# Altium schematic symbol library jlcpcb_2025_04_inductors_extended_0603.schlib: 1269 symbols (part 6 of 7) (continued)
## SDWL1608C2N2SSTF
designator L?  Inductance: 2.2nH
Inductor, 2.2nH, 150mΩ, 700mA, SMD 0603; Manufacturer: Sunlord; Manufacturer Part Number: SDWL1608C2N2SSTF; Package Size: 0603; JLCPCB Basic Part: No; JLCPCB Part Number: C334256; Supplier 1: LCSC; Category: Inductors; Supplier Part Number 1: C334256; Rated Current: 700mA; DC Resistance: 150mΩ; RoHS: Yes; ComponentLink1Description: Datasheet; ComponentLink1URL: https://wmsc.lcsc.com/wmsc/upload/file/pdf/v2/lcsc/2110081430_Sunlord-SDWL1608C2N2SSTF_C334256.pdf; ComponentLink2Description: JLCPCB Part URL; ComponentLink2URL: https://jlcpcb.com/partdetail/C334256; ComponentLink3Description: LCSC Part URL; ComponentLink3URL: https://lcsc.com/product-detail/Inductors-SMD_Sunlord-Sunlord-SDWL1608C2N2SSTF_C334256.html
footprint IND-0603 (0603 (1608M) Inductor)
pins: 1, 2

## SDWL1608C2N2SSTFM01
designator L?  Inductance: 2.2nH
Inductor, 2.2nH, 49mΩ, 700mA, SMD 0603; Manufacturer: Sunlord; Manufacturer Part Number: SDWL1608C2N2SSTFM01; Package Size: 0603; JLCPCB Basic Part: No; JLCPCB Part Number: C408713; Supplier 1: LCSC; Category: Inductors; Supplier Part Number 1: C408713; Rated Current: 700mA; DC Resistance: 49mΩ; RoHS: Yes; ComponentLink1Description: Datasheet; ComponentLink1URL: https://wmsc.lcsc.com/wmsc/upload/file/pdf/v2/lcsc/2110081530_Sunlord-SDWL1608C2N2SSTFM01_C408713.pdf; ComponentLink2Description: JLCPCB Part URL; ComponentLink2URL: https://jlcpcb.com/partdetail/C408713; ComponentLink3Description: LCSC Part URL; ComponentLink3URL: https://lcsc.com/product-detail/Inductors-SMD_Sunlord-Sunlord-SDWL1608C2N2SSTFM01_C408713.html
footprint IND-0603 (0603 (1608M) Inductor)
pins: 1, 2

## SDWL1608C2N7CSTF
designator L?  Inductance: 2.7nH
Inductor, 2.7nH, 43mΩ, 1A, SMD 0603; Manufacturer: Sunlord; Manufacturer Part Number: SDWL1608C2N7CSTF; Package Size: 0603; JLCPCB Basic Part: No; JLCPCB Part Number: C370335; Supplier 1: LCSC; Category: Inductors; Supplier Part Number 1: C370335; Rated Current: 1A; DC Resistance: 43mΩ; RoHS: Yes; ComponentLink1Description: Datasheet; ComponentLink1URL: https://wmsc.lcsc.com/wmsc/upload/file/pdf/v2/lcsc/2110081530_Sunlord-SDWL1608C2N7CSTF_C370335.pdf; ComponentLink2Description: JLCPCB Part URL; ComponentLink2URL: https://jlcpcb.com/partdetail/C370335; ComponentLink3Description: LCSC Part URL; ComponentLink3URL: https://lcsc.com/product-detail/Inductors-SMD_Sunlord-Sunlord-SDWL1608C2N7CSTF_C370335.html
footprint IND-0603 (0603 (1608M) Inductor)
pins: 1, 2

## SDWL1608C2N7JSTF
designator L?  Inductance: 2.7nH
Inductor, 2.7nH, ±5%, 43mΩ, 1A, SMD 0603; Manufacturer: Sunlord; Manufacturer Part Number: SDWL1608C2N7JSTF; Package Size: 0603; JLCPCB Basic Part: No; JLCPCB Part Number: C370336; Supplier 1: LCSC; Category: Inductors; Supplier Part Number 1: C370336; Tolerance: ±5%; Rated Current: 1A; DC Resistance: 43mΩ; RoHS: Yes; ComponentLink1Description: Datasheet; ComponentLink1URL: https://wmsc.lcsc.com/wmsc/upload/file/pdf/v2/lcsc/2110081530_Sunlord-SDWL1608C2N7JSTF_C370336.pdf; ComponentLink2Description: JLCPCB Part URL; ComponentLink2URL: https://jlcpcb.com/partdetail/C370336; ComponentLink3Description: LCSC Part URL; ComponentLink3URL: https://lcsc.com/product-detail/Inductors-SMD_Sunlord-Sunlord-SDWL1608C2N7JSTF_C370336.html
footprint IND-0603 (0603 (1608M) Inductor)
pins: 1, 2

## SDWL1608C2N7SSTF
designator L?  Inductance: 2.7nH
Inductor, 2.7nH, 43mΩ, 1A, SMD 0603; Manufacturer: Sunlord; Manufacturer Part Number: SDWL1608C2N7SSTF; Package Size: 0603; JLCPCB Basic Part: No; JLCPCB Part Number: C127679; Supplier 1: LCSC; Category: Inductors; Supplier Part Number 1: C127679; Rated Current: 1A; DC Resistance: 43mΩ; RoHS: Yes; ComponentLink1Description: Datasheet; ComponentLink1URL: https://wmsc.lcsc.com/wmsc/upload/file/pdf/v2/lcsc/2110081330_Sunlord-SDWL1608C2N7SSTF_C127679.pdf; ComponentLink2Description: JLCPCB Part URL; ComponentLink2URL: https://jlcpcb.com/partdetail/C127679; ComponentLink3Description: LCSC Part URL; ComponentLink3URL: https://lcsc.com/product-detail/Inductors-SMD_Sunlord-Sunlord-SDWL1608C2N7SSTF_C127679.html
footprint IND-0603 (0603 (1608M) Inductor)
pins: 1, 2

## SDWL1608C3N3CSTF
designator L?  Inductance: 3.3nH
Inductor, 3.3nH, 59mΩ, 850mA, SMD 0603; Manufacturer: Sunlord; Manufacturer Part Number: SDWL1608C3N3CSTF; Package Size: 0603; JLCPCB Basic Part: No; JLCPCB Part Number: C370341; Supplier 1: LCSC; Category: Inductors; Supplier Part Number 1: C370341; Rated Current: 850mA; DC Resistance: 59mΩ; RoHS: Yes; ComponentLink1Description: Datasheet; ComponentLink1URL: https://wmsc.lcsc.com/wmsc/upload/file/pdf/v2/lcsc/2110081530_Sunlord-SDWL1608C3N3CSTF_C370341.pdf; ComponentLink2Description: JLCPCB Part URL; ComponentLink2URL: https://jlcpcb.com/partdetail/C370341; ComponentLink3Description: LCSC Part URL; ComponentLink3URL: https://lcsc.com/product-detail/Inductors-SMD_Sunlord-Sunlord-SDWL1608C3N3CSTF_C370341.html
footprint IND-0603 (0603 (1608M) Inductor)
pins: 1, 2

## SDWL1608C3N3JSTF
designator L?  Inductance: 3.3nH
Inductor, 3.3nH, ±5%, 59mΩ, 850mA, SMD 0603; Manufacturer: Sunlord; Manufacturer Part Number: SDWL1608C3N3JSTF; Package Size: 0603; JLCPCB Basic Part: No; JLCPCB Part Number: C370342; Supplier 1: LCSC; Category: Inductors; Supplier Part Number 1: C370342; Tolerance: ±5%; Rated Current: 850mA; DC Resistance: 59mΩ; RoHS: Yes; ComponentLink1Description: Datasheet; ComponentLink1URL: https://wmsc.lcsc.com/wmsc/upload/file/pdf/v2/lcsc/2110081530_Sunlord-SDWL1608C3N3JSTF_C370342.pdf; ComponentLink2Description: JLCPCB Part URL; ComponentLink2URL: https://jlcpcb.com/partdetail/C370342; ComponentLink3Description: LCSC Part URL; ComponentLink3URL: https://lcsc.com/product-detail/Inductors-SMD_Sunlord-Sunlord-SDWL1608C3N3JSTF_C370342.html
footprint IND-0603 (0603 (1608M) Inductor)
pins: 1, 2

## SDWL1608C3N6CSTF
designator L?  Inductance: 3.6nH
Inductor, 3.6nH, 59mΩ, 850mA, SMD 0603; Manufacturer: Sunlord; Manufacturer Part Number: SDWL1608C3N6CSTF; Package Size: 0603; JLCPCB Basic Part: No; JLCPCB Part Number: C370343; Supplier 1: LCSC; Category: Inductors; Supplier Part Number 1: C370343; Rated Current: 850mA; DC Resistance: 59mΩ; RoHS: Yes; ComponentLink1Description: Datasheet; ComponentLink1URL: https://wmsc.lcsc.com/wmsc/upload/file/pdf/v2/lcsc/2110081530_Sunlord-SDWL1608C3N6CSTF_C370343.pdf; ComponentLink2Description: JLCPCB Part URL; ComponentLink2URL: https://jlcpcb.com/partdetail/C370343; ComponentLink3Description: LCSC Part URL; ComponentLink3URL: https://lcsc.com/product-detail/Inductors-SMD_Sunlord-Sunlord-SDWL1608C3N6CSTF_C370343.html
footprint IND-0603 (0603 (1608M) Inductor)
pins: 1, 2

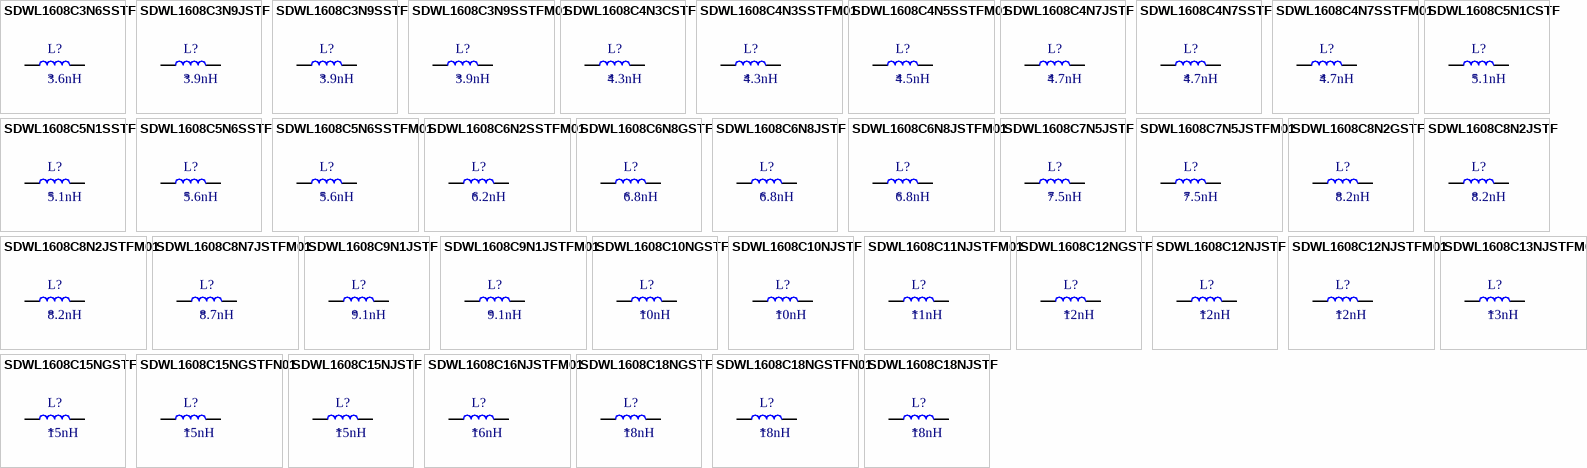
[diagram p27: symbols SDWL1608C3N6SSTF to SDWL1608C18NJSTF]

## SDWL1608C3N6SSTF
designator L?  Inductance: 3.6nH
Inductor, 3.6nH, 59mΩ, 850mA, SMD 0603; Manufacturer: Sunlord; Manufacturer Part Number: SDWL1608C3N6SSTF; Package Size: 0603; JLCPCB Basic Part: No; JLCPCB Part Number: C334258; Supplier 1: LCSC; Category: Inductors; Supplier Part Number 1: C334258; Rated Current: 850mA; DC Resistance: 59mΩ; RoHS: Yes; ComponentLink1Description: Datasheet; ComponentLink1URL: https://wmsc.lcsc.com/wmsc/upload/file/pdf/v2/lcsc/2110081430_Sunlord-SDWL1608C3N6SSTF_C334258.pdf; ComponentLink2Description: JLCPCB Part URL; ComponentLink2URL: https://jlcpcb.com/partdetail/C334258; ComponentLink3Description: LCSC Part URL; ComponentLink3URL: https://lcsc.com/product-detail/Inductors-SMD_Sunlord-Sunlord-SDWL1608C3N6SSTF_C334258.html
footprint IND-0603 (0603 (1608M) Inductor)
pins: 1, 2

## SDWL1608C3N9JSTF
designator L?  Inductance: 3.9nH
Inductor, 3.9nH, ±5%, 59mΩ, 850mA, SMD 0603; Manufacturer: Sunlord; Manufacturer Part Number: SDWL1608C3N9JSTF; Package Size: 0603; JLCPCB Basic Part: No; JLCPCB Part Number: C370344; Supplier 1: LCSC; Category: Inductors; Supplier Part Number 1: C370344; Tolerance: ±5%; Rated Current: 850mA; DC Resistance: 59mΩ; RoHS: Yes; ComponentLink1Description: Datasheet; ComponentLink1URL: https://wmsc.lcsc.com/wmsc/upload/file/pdf/v2/lcsc/2110081530_Sunlord-SDWL1608C3N9JSTF_C370344.pdf; ComponentLink2Description: JLCPCB Part URL; ComponentLink2URL: https://jlcpcb.com/partdetail/C370344; ComponentLink3Description: LCSC Part URL; ComponentLink3URL: https://lcsc.com/product-detail/Inductors-SMD_Sunlord-Sunlord-SDWL1608C3N9JSTF_C370344.html
footprint IND-0603 (0603 (1608M) Inductor)
pins: 1, 2

## SDWL1608C3N9SSTF
designator L?  Inductance: 3.9nH
Inductor, 3.9nH, 59mΩ, 850mA, SMD 0603; Manufacturer: Sunlord; Manufacturer Part Number: SDWL1608C3N9SSTF; Package Size: 0603; JLCPCB Basic Part: No; JLCPCB Part Number: C95950; Supplier 1: LCSC; Category: Inductors; Supplier Part Number 1: C95950; Rated Current: 850mA; DC Resistance: 59mΩ; RoHS: Yes; ComponentLink1Description: Datasheet; ComponentLink1URL: https://wmsc.lcsc.com/wmsc/upload/file/pdf/v2/lcsc/2110081230_Sunlord-SDWL1608C3N9SSTF_C95950.pdf; ComponentLink2Description: JLCPCB Part URL; ComponentLink2URL: https://jlcpcb.com/partdetail/C95950; ComponentLink3Description: LCSC Part URL; ComponentLink3URL: https://lcsc.com/product-detail/Inductors-SMD_Sunlord-Sunlord-SDWL1608C3N9SSTF_C95950.html
footprint IND-0603 (0603 (1608M) Inductor)
pins: 1, 2

## SDWL1608C3N9SSTFM01
designator L?  Inductance: 3.9nH
Inductor, 3.9nH, 59mΩ, 850mA, SMD 0603; Manufacturer: Sunlord; Manufacturer Part Number: SDWL1608C3N9SSTFM01; Package Size: 0603; JLCPCB Basic Part: No; JLCPCB Part Number: C408715; Supplier 1: LCSC; Category: Inductors; Supplier Part Number 1: C408715; Rated Current: 850mA; DC Resistance: 59mΩ; RoHS: Yes; ComponentLink1Description: Datasheet; ComponentLink1URL: https://wmsc.lcsc.com/wmsc/upload/file/pdf/v2/lcsc/2110081530_Sunlord-SDWL1608C3N9SSTFM01_C408715.pdf; ComponentLink2Description: JLCPCB Part URL; ComponentLink2URL: https://jlcpcb.com/partdetail/C408715; ComponentLink3Description: LCSC Part URL; ComponentLink3URL: https://lcsc.com/product-detail/Inductors-SMD_Sunlord-Sunlord-SDWL1608C3N9SSTFM01_C408715.html
footprint IND-0603 (0603 (1608M) Inductor)
pins: 1, 2

## SDWL1608C4N3CSTF
designator L?  Inductance: 4.3nH
Inductor, 4.3nH, 59mΩ, 850mA, SMD 0603; Manufacturer: Sunlord; Manufacturer Part Number: SDWL1608C4N3CSTF; Package Size: 0603; JLCPCB Basic Part: No; JLCPCB Part Number: C370348; Supplier 1: LCSC; Category: Inductors; Supplier Part Number 1: C370348; Rated Current: 850mA; DC Resistance: 59mΩ; RoHS: Yes; ComponentLink1Description: Datasheet; ComponentLink1URL: https://wmsc.lcsc.com/wmsc/upload/file/pdf/v2/lcsc/2110081530_Sunlord-SDWL1608C4N3CSTF_C370348.pdf; ComponentLink2Description: JLCPCB Part URL; ComponentLink2URL: https://jlcpcb.com/partdetail/C370348; ComponentLink3Description: LCSC Part URL; ComponentLink3URL: https://lcsc.com/product-detail/Inductors-SMD_Sunlord-Sunlord-SDWL1608C4N3CSTF_C370348.html
footprint IND-0603 (0603 (1608M) Inductor)
pins: 1, 2

## SDWL1608C4N3SSTFM01
designator L?  Inductance: 4.3nH
Inductor, 4.3nH, 59mΩ, 850mA, SMD 0603; Manufacturer: Sunlord; Manufacturer Part Number: SDWL1608C4N3SSTFM01; Package Size: 0603; JLCPCB Basic Part: No; JLCPCB Part Number: C408716; Supplier 1: LCSC; Category: Inductors; Supplier Part Number 1: C408716; Rated Current: 850mA; DC Resistance: 59mΩ; RoHS: Yes; ComponentLink1Description: Datasheet; ComponentLink1URL: https://wmsc.lcsc.com/wmsc/upload/file/pdf/v2/lcsc/2110081530_Sunlord-SDWL1608C4N3SSTFM01_C408716.pdf; ComponentLink2Description: JLCPCB Part URL; ComponentLink2URL: https://jlcpcb.com/partdetail/C408716; ComponentLink3Description: LCSC Part URL; ComponentLink3URL: https://lcsc.com/product-detail/Inductors-SMD_Sunlord-Sunlord-SDWL1608C4N3SSTFM01_C408716.html
footprint IND-0603 (0603 (1608M) Inductor)
pins: 1, 2

## SDWL1608C4N5SSTFM01
designator L?  Inductance: 4.5nH
Inductor, 4.5nH, 59mΩ, 850mA, SMD 0603; Manufacturer: Sunlord; Manufacturer Part Number: SDWL1608C4N5SSTFM01; Package Size: 0603; JLCPCB Basic Part: No; JLCPCB Part Number: C408717; Supplier 1: LCSC; Category: Inductors; Supplier Part Number 1: C408717; Rated Current: 850mA; DC Resistance: 59mΩ; RoHS: Yes; ComponentLink1Description: Datasheet; ComponentLink1URL: https://wmsc.lcsc.com/wmsc/upload/file/pdf/v2/lcsc/2110081530_Sunlord-SDWL1608C4N5SSTFM01_C408717.pdf; ComponentLink2Description: JLCPCB Part URL; ComponentLink2URL: https://jlcpcb.com/partdetail/C408717; ComponentLink3Description: LCSC Part URL; ComponentLink3URL: https://lcsc.com/product-detail/Inductors-SMD_Sunlord-Sunlord-SDWL1608C4N5SSTFM01_C408717.html
footprint IND-0603 (0603 (1608M) Inductor)
pins: 1, 2

## SDWL1608C4N7JSTF
designator L?  Inductance: 4.7nH
Inductor, 4.7nH, ±5%, 65mΩ, 800mA, SMD 0603; Manufacturer: Sunlord; Manufacturer Part Number: SDWL1608C4N7JSTF; Package Size: 0603; JLCPCB Basic Part: No; JLCPCB Part Number: C316377; Supplier 1: LCSC; Category: Inductors; Supplier Part Number 1: C316377; Tolerance: ±5%; Rated Current: 800mA; DC Resistance: 65mΩ; RoHS: Yes; ComponentLink1Description: Datasheet; ComponentLink1URL: https://wmsc.lcsc.com/wmsc/upload/file/pdf/v2/lcsc/2110081430_Sunlord-SDWL1608C4N7JSTF_C316377.pdf; ComponentLink2Description: JLCPCB Part URL; ComponentLink2URL: https://jlcpcb.com/partdetail/C316377; ComponentLink3Description: LCSC Part URL; ComponentLink3URL: https://lcsc.com/product-detail/Inductors-SMD_Sunlord-Sunlord-SDWL1608C4N7JSTF_C316377.html
footprint IND-0603 (0603 (1608M) Inductor)
pins: 1, 2

## SDWL1608C4N7SSTF
designator L?  Inductance: 4.7nH
Inductor, 4.7nH, 65mΩ, 800mA, SMD 0603; Manufacturer: Sunlord; Manufacturer Part Number: SDWL1608C4N7SSTF; Package Size: 0603; JLCPCB Basic Part: No; JLCPCB Part Number: C316376; Supplier 1: LCSC; Category: Inductors; Supplier Part Number 1: C316376; Rated Current: 800mA; DC Resistance: 65mΩ; RoHS: Yes; ComponentLink1Description: Datasheet; ComponentLink1URL: https://wmsc.lcsc.com/wmsc/upload/file/pdf/v2/lcsc/2110081430_Sunlord-SDWL1608C4N7SSTF_C316376.pdf; ComponentLink2Description: JLCPCB Part URL; ComponentLink2URL: https://jlcpcb.com/partdetail/C316376; ComponentLink3Description: LCSC Part URL; ComponentLink3URL: https://lcsc.com/product-detail/Inductors-SMD_Sunlord-Sunlord-SDWL1608C4N7SSTF_C316376.html
footprint IND-0603 (0603 (1608M) Inductor)
pins: 1, 2

## SDWL1608C4N7SSTFM01
designator L?  Inductance: 4.7nH
Inductor, 4.7nH, 59mΩ, 850mA, SMD 0603; Manufacturer: Sunlord; Manufacturer Part Number: SDWL1608C4N7SSTFM01; Package Size: 0603; JLCPCB Basic Part: No; JLCPCB Part Number: C408718; Supplier 1: LCSC; Category: Inductors; Supplier Part Number 1: C408718; Rated Current: 850mA; DC Resistance: 59mΩ; RoHS: Yes; ComponentLink1Description: Datasheet; ComponentLink1URL: https://wmsc.lcsc.com/wmsc/upload/file/pdf/v2/lcsc/2110081530_Sunlord-SDWL1608C4N7SSTFM01_C408718.pdf; ComponentLink2Description: JLCPCB Part URL; ComponentLink2URL: https://jlcpcb.com/partdetail/C408718; ComponentLink3Description: LCSC Part URL; ComponentLink3URL: https://lcsc.com/product-detail/Inductors-SMD_Sunlord-Sunlord-SDWL1608C4N7SSTFM01_C408718.html
footprint IND-0603 (0603 (1608M) Inductor)
pins: 1, 2

## SDWL1608C5N1CSTF
designator L?  Inductance: 5.1nH
Inductor, 5.1nH, 130mΩ, 600mA, SMD 0603; Manufacturer: Sunlord; Manufacturer Part Number: SDWL1608C5N1CSTF; Package Size: 0603; JLCPCB Basic Part: No; JLCPCB Part Number: C370350; Supplier 1: LCSC; Category: Inductors; Supplier Part Number 1: C370350; Rated Current: 600mA; DC Resistance: 130mΩ; RoHS: Yes; ComponentLink1Description: Datasheet; ComponentLink1URL: https://wmsc.lcsc.com/wmsc/upload/file/pdf/v2/lcsc/2110081530_Sunlord-SDWL1608C5N1CSTF_C370350.pdf; ComponentLink2Description: JLCPCB Part URL; ComponentLink2URL: https://jlcpcb.com/partdetail/C370350; ComponentLink3Description: LCSC Part URL; ComponentLink3URL: https://lcsc.com/product-detail/Inductors-SMD_Sunlord-Sunlord-SDWL1608C5N1CSTF_C370350.html
footprint IND-0603 (0603 (1608M) Inductor)
pins: 1, 2

## SDWL1608C5N1SSTF
designator L?  Inductance: 5.1nH
Inductor, 5.1nH, 130mΩ, 600mA, SMD 0603; Manufacturer: Sunlord; Manufacturer Part Number: SDWL1608C5N1SSTF; Package Size: 0603; JLCPCB Basic Part: No; JLCPCB Part Number: C334259; Supplier 1: LCSC; Category: Inductors; Supplier Part Number 1: C334259; Rated Current: 600mA; DC Resistance: 130mΩ; RoHS: Yes; ComponentLink1Description: Datasheet; ComponentLink1URL: https://wmsc.lcsc.com/wmsc/upload/file/pdf/v2/lcsc/2110081430_Sunlord-SDWL1608C5N1SSTF_C334259.pdf; ComponentLink2Description: JLCPCB Part URL; ComponentLink2URL: https://jlcpcb.com/partdetail/C334259; ComponentLink3Description: LCSC Part URL; ComponentLink3URL: https://lcsc.com/product-detail/Inductors-SMD_Sunlord-Sunlord-SDWL1608C5N1SSTF_C334259.html
footprint IND-0603 (0603 (1608M) Inductor)
pins: 1, 2

## SDWL1608C5N6SSTF
designator L?  Inductance: 5.6nH
Inductor, 5.6nH, 130mΩ, 620mA, SMD 0603; Manufacturer: Sunlord; Manufacturer Part Number: SDWL1608C5N6SSTF; Package Size: 0603; JLCPCB Basic Part: No; JLCPCB Part Number: C361507; Supplier 1: LCSC; Category: Inductors; Supplier Part Number 1: C361507; Rated Current: 620mA; DC Resistance: 130mΩ; RoHS: Yes; ComponentLink1Description: Datasheet; ComponentLink1URL: https://wmsc.lcsc.com/wmsc/upload/file/pdf/v2/lcsc/2110081430_Sunlord-SDWL1608C5N6SSTF_C361507.pdf; ComponentLink2Description: JLCPCB Part URL; ComponentLink2URL: https://jlcpcb.com/partdetail/C361507; ComponentLink3Description: LCSC Part URL; ComponentLink3URL: https://lcsc.com/product-detail/Inductors-SMD_Sunlord-Sunlord-SDWL1608C5N6SSTF_C361507.html
footprint IND-0603 (0603 (1608M) Inductor)
pins: 1, 2

## SDWL1608C5N6SSTFM01
designator L?  Inductance: 5.6nH
Inductor, 5.6nH, 82mΩ, 750mA, SMD 0603; Manufacturer: Sunlord; Manufacturer Part Number: SDWL1608C5N6SSTFM01; Package Size: 0603; JLCPCB Basic Part: No; JLCPCB Part Number: C408719; Supplier 1: LCSC; Category: Inductors; Supplier Part Number 1: C408719; Rated Current: 750mA; DC Resistance: 82mΩ; RoHS: Yes; ComponentLink1Description: Datasheet; ComponentLink1URL: https://wmsc.lcsc.com/wmsc/upload/file/pdf/v2/lcsc/2110081530_Sunlord-SDWL1608C5N6SSTFM01_C408719.pdf; ComponentLink2Description: JLCPCB Part URL; ComponentLink2URL: https://jlcpcb.com/partdetail/C408719; ComponentLink3Description: LCSC Part URL; ComponentLink3URL: https://lcsc.com/product-detail/Inductors-SMD_Sunlord-Sunlord-SDWL1608C5N6SSTFM01_C408719.html
footprint IND-0603 (0603 (1608M) Inductor)
pins: 1, 2

## SDWL1608C6N2SSTFM01
designator L?  Inductance: 6.2nH
Inductor, 6.2nH, 82mΩ, 750mA, SMD 0603; Manufacturer: Sunlord; Manufacturer Part Number: SDWL1608C6N2SSTFM01; Package Size: 0603; JLCPCB Basic Part: No; JLCPCB Part Number: C408720; Supplier 1: LCSC; Category: Inductors; Supplier Part Number 1: C408720; Rated Current: 750mA; DC Resistance: 82mΩ; RoHS: Yes; ComponentLink1Description: Datasheet; ComponentLink1URL: https://wmsc.lcsc.com/wmsc/upload/file/pdf/v2/lcsc/2110081530_Sunlord-SDWL1608C6N2SSTFM01_C408720.pdf; ComponentLink2Description: JLCPCB Part URL; ComponentLink2URL: https://jlcpcb.com/partdetail/C408720; ComponentLink3Description: LCSC Part URL; ComponentLink3URL: https://lcsc.com/product-detail/Inductors-SMD_Sunlord-Sunlord-SDWL1608C6N2SSTFM01_C408720.html
footprint IND-0603 (0603 (1608M) Inductor)
pins: 1, 2

## SDWL1608C6N8GSTF
designator L?  Inductance: 6.8nH
Inductor, 6.8nH, ±2%, 95mΩ, 700mA, SMD 0603; Manufacturer: Sunlord; Manufacturer Part Number: SDWL1608C6N8GSTF; Package Size: 0603; JLCPCB Basic Part: No; JLCPCB Part Number: C370353; Supplier 1: LCSC; Category: Inductors; Supplier Part Number 1: C370353; Tolerance: ±2%; Rated Current: 700mA; DC Resistance: 95mΩ; RoHS: Yes; ComponentLink1Description: Datasheet; ComponentLink1URL: https://wmsc.lcsc.com/wmsc/upload/file/pdf/v2/lcsc/2110081530_Sunlord-SDWL1608C6N8GSTF_C370353.pdf; ComponentLink2Description: JLCPCB Part URL; ComponentLink2URL: https://jlcpcb.com/partdetail/C370353; ComponentLink3Description: LCSC Part URL; ComponentLink3URL: https://lcsc.com/product-detail/Inductors-SMD_Sunlord-Sunlord-SDWL1608C6N8GSTF_C370353.html
footprint IND-0603 (0603 (1608M) Inductor)
pins: 1, 2

## SDWL1608C6N8JSTF
designator L?  Inductance: 6.8nH
Inductor, 6.8nH, ±5%, 95mΩ, 700mA, SMD 0603; Manufacturer: Sunlord; Manufacturer Part Number: SDWL1608C6N8JSTF; Package Size: 0603; JLCPCB Basic Part: No; JLCPCB Part Number: C316375; Supplier 1: LCSC; Category: Inductors; Supplier Part Number 1: C316375; Tolerance: ±5%; Rated Current: 700mA; DC Resistance: 95mΩ; RoHS: Yes; ComponentLink1Description: Datasheet; ComponentLink1URL: https://wmsc.lcsc.com/wmsc/upload/file/pdf/v2/lcsc/2110081430_Sunlord-SDWL1608C6N8JSTF_C316375.pdf; ComponentLink2Description: JLCPCB Part URL; ComponentLink2URL: https://jlcpcb.com/partdetail/C316375; ComponentLink3Description: LCSC Part URL; ComponentLink3URL: https://lcsc.com/product-detail/Inductors-SMD_Sunlord-Sunlord-SDWL1608C6N8JSTF_C316375.html
footprint IND-0603 (0603 (1608M) Inductor)
pins: 1, 2

## SDWL1608C6N8JSTFM01
designator L?  Inductance: 6.8nH
Inductor, 6.8nH, ±5%, 82mΩ, 750mA, SMD 0603; Manufacturer: Sunlord; Manufacturer Part Number: SDWL1608C6N8JSTFM01; Package Size: 0603; JLCPCB Basic Part: No; JLCPCB Part Number: C408721; Supplier 1: LCSC; Category: Inductors; Supplier Part Number 1: C408721; Tolerance: ±5%; Rated Current: 750mA; DC Resistance: 82mΩ; RoHS: Yes; ComponentLink1Description: Datasheet; ComponentLink1URL: https://wmsc.lcsc.com/wmsc/upload/file/pdf/v2/lcsc/2110081530_Sunlord-SDWL1608C6N8JSTFM01_C408721.pdf; ComponentLink2Description: JLCPCB Part URL; ComponentLink2URL: https://jlcpcb.com/partdetail/C408721; ComponentLink3Description: LCSC Part URL; ComponentLink3URL: https://lcsc.com/product-detail/Inductors-SMD_Sunlord-Sunlord-SDWL1608C6N8JSTFM01_C408721.html
footprint IND-0603 (0603 (1608M) Inductor)
pins: 1, 2

## SDWL1608C7N5JSTF
designator L?  Inductance: 7.5nH
Inductor, 7.5nH, ±5%, 950mΩ, 700mA, SMD 0603; Manufacturer: Sunlord; Manufacturer Part Number: SDWL1608C7N5JSTF; Package Size: 0603; JLCPCB Basic Part: No; JLCPCB Part Number: C21887; Supplier 1: LCSC; Category: Inductors; Supplier Part Number 1: C21887; Tolerance: ±5%; Rated Current: 700mA; DC Resistance: 950mΩ; RoHS: Yes; ComponentLink1Description: Datasheet; ComponentLink1URL: https://wmsc.lcsc.com/wmsc/upload/file/pdf/v2/lcsc/2110081230_Sunlord-SDWL1608C7N5JSTF_C21887.pdf; ComponentLink2Description: JLCPCB Part URL; ComponentLink2URL: https://jlcpcb.com/partdetail/C21887; ComponentLink3Description: LCSC Part URL; ComponentLink3URL: https://lcsc.com/product-detail/Inductors-SMD_Sunlord-Sunlord-SDWL1608C7N5JSTF_C21887.html
footprint IND-0603 (0603 (1608M) Inductor)
pins: 1, 2

## SDWL1608C7N5JSTFM01
designator L?  Inductance: 7.5nH
Inductor, 7.5nH, ±5%, 82mΩ, 750mA, SMD 0603; Manufacturer: Sunlord; Manufacturer Part Number: SDWL1608C7N5JSTFM01; Package Size: 0603; JLCPCB Basic Part: No; JLCPCB Part Number: C408722; Supplier 1: LCSC; Category: Inductors; Supplier Part Number 1: C408722; Tolerance: ±5%; Rated Current: 750mA; DC Resistance: 82mΩ; RoHS: Yes; ComponentLink1Description: Datasheet; ComponentLink1URL: https://wmsc.lcsc.com/wmsc/upload/file/pdf/v2/lcsc/2110081530_Sunlord-SDWL1608C7N5JSTFM01_C408722.pdf; ComponentLink2Description: JLCPCB Part URL; ComponentLink2URL: https://jlcpcb.com/partdetail/C408722; ComponentLink3Description: LCSC Part URL; ComponentLink3URL: https://lcsc.com/product-detail/Inductors-SMD_Sunlord-Sunlord-SDWL1608C7N5JSTFM01_C408722.html
footprint IND-0603 (0603 (1608M) Inductor)
pins: 1, 2

## SDWL1608C8N2GSTF
designator L?  Inductance: 8.2nH
Inductor, 8.2nH, ±2%, 95mΩ, 700mA, SMD 0603; Manufacturer: Sunlord; Manufacturer Part Number: SDWL1608C8N2GSTF; Package Size: 0603; JLCPCB Basic Part: No; JLCPCB Part Number: C370355; Supplier 1: LCSC; Category: Inductors; Supplier Part Number 1: C370355; Tolerance: ±2%; Rated Current: 700mA; DC Resistance: 95mΩ; RoHS: Yes; ComponentLink1Description: Datasheet; ComponentLink1URL: https://wmsc.lcsc.com/wmsc/upload/file/pdf/v2/lcsc/2110081530_Sunlord-SDWL1608C8N2GSTF_C370355.pdf; ComponentLink2Description: JLCPCB Part URL; ComponentLink2URL: https://jlcpcb.com/partdetail/C370355; ComponentLink3Description: LCSC Part URL; ComponentLink3URL: https://lcsc.com/product-detail/Inductors-SMD_Sunlord-Sunlord-SDWL1608C8N2GSTF_C370355.html
footprint IND-0603 (0603 (1608M) Inductor)
pins: 1, 2

## SDWL1608C8N2JSTF
designator L?  Inductance: 8.2nH
Inductor, 8.2nH, ±5%, 95mΩ, 700mA, SMD 0603; Manufacturer: Sunlord; Manufacturer Part Number: SDWL1608C8N2JSTF; Package Size: 0603; JLCPCB Basic Part: No; JLCPCB Part Number: C334261; Supplier 1: LCSC; Category: Inductors; Supplier Part Number 1: C334261; Tolerance: ±5%; Rated Current: 700mA; DC Resistance: 95mΩ; RoHS: Yes; ComponentLink1Description: Datasheet; ComponentLink1URL: https://wmsc.lcsc.com/wmsc/upload/file/pdf/v2/lcsc/2110081430_Sunlord-SDWL1608C8N2JSTF_C334261.pdf; ComponentLink2Description: JLCPCB Part URL; ComponentLink2URL: https://jlcpcb.com/partdetail/C334261; ComponentLink3Description: LCSC Part URL; ComponentLink3URL: https://lcsc.com/product-detail/Inductors-SMD_Sunlord-Sunlord-SDWL1608C8N2JSTF_C334261.html
footprint IND-0603 (0603 (1608M) Inductor)
pins: 1, 2

## SDWL1608C8N2JSTFM01
designator L?  Inductance: 8.2nH
Inductor, 8.2nH, ±5%, 110mΩ, 650mA, SMD 0603; Manufacturer: Sunlord; Manufacturer Part Number: SDWL1608C8N2JSTFM01; Package Size: 0603; JLCPCB Basic Part: No; JLCPCB Part Number: C408723; Supplier 1: LCSC; Category: Inductors; Supplier Part Number 1: C408723; Tolerance: ±5%; Rated Current: 650mA; DC Resistance: 110mΩ; RoHS: Yes; ComponentLink1Description: Datasheet; ComponentLink1URL: https://wmsc.lcsc.com/wmsc/upload/file/pdf/v2/lcsc/2110081530_Sunlord-SDWL1608C8N2JSTFM01_C408723.pdf; ComponentLink2Description: JLCPCB Part URL; ComponentLink2URL: https://jlcpcb.com/partdetail/C408723; ComponentLink3Description: LCSC Part URL; ComponentLink3URL: https://lcsc.com/product-detail/Inductors-SMD_Sunlord-Sunlord-SDWL1608C8N2JSTFM01_C408723.html
footprint IND-0603 (0603 (1608M) Inductor)
pins: 1, 2

## SDWL1608C8N7JSTFM01
designator L?  Inductance: 8.7nH
Inductor, 8.7nH, ±5%, 110mΩ, 650mA, SMD 0603; Manufacturer: Sunlord; Manufacturer Part Number: SDWL1608C8N7JSTFM01; Package Size: 0603; JLCPCB Basic Part: No; JLCPCB Part Number: C408724; Supplier 1: LCSC; Category: Inductors; Supplier Part Number 1: C408724; Tolerance: ±5%; Rated Current: 650mA; DC Resistance: 110mΩ; RoHS: Yes; ComponentLink1Description: Datasheet; ComponentLink1URL: https://wmsc.lcsc.com/wmsc/upload/file/pdf/v2/lcsc/2110081530_Sunlord-SDWL1608C8N7JSTFM01_C408724.pdf; ComponentLink2Description: JLCPCB Part URL; ComponentLink2URL: https://jlcpcb.com/partdetail/C408724; ComponentLink3Description: LCSC Part URL; ComponentLink3URL: https://lcsc.com/product-detail/Inductors-SMD_Sunlord-Sunlord-SDWL1608C8N7JSTFM01_C408724.html
footprint IND-0603 (0603 (1608M) Inductor)
pins: 1, 2

## SDWL1608C9N1JSTF
designator L?  Inductance: 9.1nH
Inductor, 9.1nH, ±5%, 120mΩ, 620mA, SMD 0603; Manufacturer: Sunlord; Manufacturer Part Number: SDWL1608C9N1JSTF; Package Size: 0603; JLCPCB Basic Part: No; JLCPCB Part Number: C334262; Supplier 1: LCSC; Category: Inductors; Supplier Part Number 1: C334262; Tolerance: ±5%; Rated Current: 620mA; DC Resistance: 120mΩ; RoHS: Yes; ComponentLink1Description: Datasheet; ComponentLink1URL: https://wmsc.lcsc.com/wmsc/upload/file/pdf/v2/lcsc/2110081430_Sunlord-SDWL1608C9N1JSTF_C334262.pdf; ComponentLink2Description: JLCPCB Part URL; ComponentLink2URL: https://jlcpcb.com/partdetail/C334262; ComponentLink3Description: LCSC Part URL; ComponentLink3URL: https://lcsc.com/product-detail/Inductors-SMD_Sunlord-Sunlord-SDWL1608C9N1JSTF_C334262.html
footprint IND-0603 (0603 (1608M) Inductor)
pins: 1, 2

## SDWL1608C9N1JSTFM01
designator L?  Inductance: 9.1nH
Inductor, 9.1nH, ±5%, 110mΩ, 650mA, SMD 0603; Manufacturer: Sunlord; Manufacturer Part Number: SDWL1608C9N1JSTFM01; Package Size: 0603; JLCPCB Basic Part: No; JLCPCB Part Number: C408725; Supplier 1: LCSC; Category: Inductors; Supplier Part Number 1: C408725; Tolerance: ±5%; Rated Current: 650mA; DC Resistance: 110mΩ; RoHS: Yes; ComponentLink1Description: Datasheet; ComponentLink1URL: https://wmsc.lcsc.com/wmsc/upload/file/pdf/v2/lcsc/2110081530_Sunlord-SDWL1608C9N1JSTFM01_C408725.pdf; ComponentLink2Description: JLCPCB Part URL; ComponentLink2URL: https://jlcpcb.com/partdetail/C408725; ComponentLink3Description: LCSC Part URL; ComponentLink3URL: https://lcsc.com/product-detail/Inductors-SMD_Sunlord-Sunlord-SDWL1608C9N1JSTFM01_C408725.html
footprint IND-0603 (0603 (1608M) Inductor)
pins: 1, 2

## SDWL1608C10NGSTF
designator L?  Inductance: 10nH
Inductor, 10nH, ±2%, 130mΩ, 600mA, SMD 0603; Manufacturer: Sunlord; Manufacturer Part Number: SDWL1608C10NGSTF; Package Size: 0603; JLCPCB Basic Part: No; JLCPCB Part Number: C370321; Supplier 1: LCSC; Category: Inductors; Supplier Part Number 1: C370321; Tolerance: ±2%; Rated Current: 600mA; DC Resistance: 130mΩ; RoHS: Yes; ComponentLink1Description: Datasheet; ComponentLink1URL: https://wmsc.lcsc.com/wmsc/upload/file/pdf/v2/lcsc/2109161630_Sunlord-SDWL1608C10NGSTF_C370321.pdf; ComponentLink2Description: JLCPCB Part URL; ComponentLink2URL: https://jlcpcb.com/partdetail/C370321; ComponentLink3Description: LCSC Part URL; ComponentLink3URL: https://lcsc.com/product-detail/Inductors-SMD_Sunlord-Sunlord-SDWL1608C10NGSTF_C370321.html
footprint IND-0603 (0603 (1608M) Inductor)
pins: 1, 2

## SDWL1608C10NJSTF
designator L?  Inductance: 10nH
Inductor, 10nH, ±5%, 130mΩ, 600mA, SMD 0603; Manufacturer: Sunlord; Manufacturer Part Number: SDWL1608C10NJSTF; Package Size: 0603; JLCPCB Basic Part: No; JLCPCB Part Number: C334263; Supplier 1: LCSC; Category: Inductors; Supplier Part Number 1: C334263; Tolerance: ±5%; Rated Current: 600mA; DC Resistance: 130mΩ; RoHS: Yes; ComponentLink1Description: Datasheet; ComponentLink1URL: https://wmsc.lcsc.com/wmsc/upload/file/pdf/v2/lcsc/2110081430_Sunlord-SDWL1608C10NJSTF_C334263.pdf; ComponentLink2Description: JLCPCB Part URL; ComponentLink2URL: https://jlcpcb.com/partdetail/C334263; ComponentLink3Description: LCSC Part URL; ComponentLink3URL: https://lcsc.com/product-detail/Inductors-SMD_Sunlord-Sunlord-SDWL1608C10NJSTF_C334263.html
footprint IND-0603 (0603 (1608M) Inductor)
pins: 1, 2

## SDWL1608C11NJSTFM01
designator L?  Inductance: 11nH
Inductor, 11nH, ±5%, 110mΩ, 650mA, SMD 0603; Manufacturer: Sunlord; Manufacturer Part Number: SDWL1608C11NJSTFM01; Self-Resonant Frequency: 100MHz; Q Factor: 35@250MHz; Package Size: 0603; JLCPCB Basic Part: No; JLCPCB Part Number: C408728; Supplier 1: LCSC; Category: Inductors; Supplier Part Number 1: C408728; Tolerance: ±5%; Rated Current: 650mA; DC Resistance: 110mΩ; RoHS: Yes; ComponentLink1Description: Datasheet; ComponentLink1URL: https://wmsc.lcsc.com/wmsc/upload/file/pdf/v2/lcsc/2110081530_Sunlord-SDWL1608C11NJSTFM01_C408728.pdf; ComponentLink2Description: JLCPCB Part URL; ComponentLink2URL: https://jlcpcb.com/partdetail/C408728; ComponentLink3Description: LCSC Part URL; ComponentLink3URL: https://lcsc.com/product-detail/Inductors-SMD_Sunlord-Sunlord-SDWL1608C11NJSTFM01_C408728.html
footprint IND-0603 (0603 (1608M) Inductor)
pins: 1, 2

## SDWL1608C12NGSTF
designator L?  Inductance: 12nH
Inductor, 12nH, ±2%, 130mΩ, 600mA, SMD 0603; Manufacturer: Sunlord; Manufacturer Part Number: SDWL1608C12NGSTF; Package Size: 0603; JLCPCB Basic Part: No; JLCPCB Part Number: C370322; Supplier 1: LCSC; Category: Inductors; Supplier Part Number 1: C370322; Tolerance: ±2%; Rated Current: 600mA; DC Resistance: 130mΩ; RoHS: Yes; ComponentLink1Description: Datasheet; ComponentLink1URL: https://wmsc.lcsc.com/wmsc/upload/file/pdf/v2/lcsc/2110081530_Sunlord-SDWL1608C12NGSTF_C370322.pdf; ComponentLink2Description: JLCPCB Part URL; ComponentLink2URL: https://jlcpcb.com/partdetail/C370322; ComponentLink3Description: LCSC Part URL; ComponentLink3URL: https://lcsc.com/product-detail/Inductors-SMD_Sunlord-Sunlord-SDWL1608C12NGSTF_C370322.html
footprint IND-0603 (0603 (1608M) Inductor)
pins: 1, 2

## SDWL1608C12NJSTF
designator L?  Inductance: 12nH
Inductor, 12nH, ±5%, 130mΩ, 600mA, SMD 0603; Manufacturer: Sunlord; Manufacturer Part Number: SDWL1608C12NJSTF; Package Size: 0603; JLCPCB Basic Part: No; JLCPCB Part Number: C316385; Supplier 1: LCSC; Category: Inductors; Supplier Part Number 1: C316385; Tolerance: ±5%; Rated Current: 600mA; DC Resistance: 130mΩ; RoHS: Yes; ComponentLink1Description: Datasheet; ComponentLink1URL: https://wmsc.lcsc.com/wmsc/upload/file/pdf/v2/lcsc/2110081430_Sunlord-SDWL1608C12NJSTF_C316385.pdf; ComponentLink2Description: JLCPCB Part URL; ComponentLink2URL: https://jlcpcb.com/partdetail/C316385; ComponentLink3Description: LCSC Part URL; ComponentLink3URL: https://lcsc.com/product-detail/Inductors-SMD_Sunlord-Sunlord-SDWL1608C12NJSTF_C316385.html
footprint IND-0603 (0603 (1608M) Inductor)
pins: 1, 2

## SDWL1608C12NJSTFM01
designator L?  Inductance: 12nH
Inductor, 12nH, ±5%, 130mΩ, 600mA, SMD 0603; Manufacturer: Sunlord; Manufacturer Part Number: SDWL1608C12NJSTFM01; Self-Resonant Frequency: 100MHz; Q Factor: 35@250MHz; Package Size: 0603; JLCPCB Basic Part: No; JLCPCB Part Number: C408729; Supplier 1: LCSC; Category: Inductors; Supplier Part Number 1: C408729; Tolerance: ±5%; Rated Current: 600mA; DC Resistance: 130mΩ; RoHS: Yes; ComponentLink1Description: Datasheet; ComponentLink1URL: https://wmsc.lcsc.com/wmsc/upload/file/pdf/v2/lcsc/2110081530_Sunlord-SDWL1608C12NJSTFM01_C408729.pdf; ComponentLink2Description: JLCPCB Part URL; ComponentLink2URL: https://jlcpcb.com/partdetail/C408729; ComponentLink3Description: LCSC Part URL; ComponentLink3URL: https://lcsc.com/product-detail/Inductors-SMD_Sunlord-Sunlord-SDWL1608C12NJSTFM01_C408729.html
footprint IND-0603 (0603 (1608M) Inductor)
pins: 1, 2

## SDWL1608C13NJSTFM01
designator L?  Inductance: 13nH
Inductor, 13nH, ±5%, 130mΩ, 600mA, SMD 0603; Manufacturer: Sunlord; Manufacturer Part Number: SDWL1608C13NJSTFM01; Self-Resonant Frequency: 100MHz; Q Factor: 35@250MHz; Package Size: 0603; JLCPCB Basic Part: No; JLCPCB Part Number: C408730; Supplier 1: LCSC; Category: Inductors; Supplier Part Number 1: C408730; Tolerance: ±5%; Rated Current: 600mA; DC Resistance: 130mΩ; RoHS: Yes; ComponentLink1Description: Datasheet; ComponentLink1URL: https://wmsc.lcsc.com/wmsc/upload/file/pdf/v2/lcsc/2110081530_Sunlord-SDWL1608C13NJSTFM01_C408730.pdf; ComponentLink2Description: JLCPCB Part URL; ComponentLink2URL: https://jlcpcb.com/partdetail/C408730; ComponentLink3Description: LCSC Part URL; ComponentLink3URL: https://lcsc.com/product-detail/Inductors-SMD_Sunlord-Sunlord-SDWL1608C13NJSTFM01_C408730.html
footprint IND-0603 (0603 (1608M) Inductor)
pins: 1, 2

## SDWL1608C15NGSTF
designator L?  Inductance: 15nH
Inductor, 15nH, ±2%, 150mΩ, 550mA, SMD 0603; Manufacturer: Sunlord; Manufacturer Part Number: SDWL1608C15NGSTF; Package Size: 0603; JLCPCB Basic Part: No; JLCPCB Part Number: C370323; Supplier 1: LCSC; Category: Inductors; Supplier Part Number 1: C370323; Tolerance: ±2%; Rated Current: 550mA; DC Resistance: 150mΩ; RoHS: Yes; ComponentLink1Description: Datasheet; ComponentLink1URL: https://wmsc.lcsc.com/wmsc/upload/file/pdf/v2/lcsc/2110081530_Sunlord-SDWL1608C15NGSTF_C370323.pdf; ComponentLink2Description: JLCPCB Part URL; ComponentLink2URL: https://jlcpcb.com/partdetail/C370323; ComponentLink3Description: LCSC Part URL; ComponentLink3URL: https://lcsc.com/product-detail/Inductors-SMD_Sunlord-Sunlord-SDWL1608C15NGSTF_C370323.html
footprint IND-0603 (0603 (1608M) Inductor)
pins: 1, 2

## SDWL1608C15NGSTFN01
designator L?  Inductance: 15nH
Inductor, 15nH, ±2%, SMD 0603; Manufacturer: Sunlord; Manufacturer Part Number: SDWL1608C15NGSTFN01; Package Size: 0603; JLCPCB Basic Part: No; JLCPCB Part Number: C2988096; Supplier 1: LCSC; Category: Inductors; Supplier Part Number 1: C2988096; Tolerance: ±2%; RoHS: Yes; ComponentLink1Description: Datasheet; ComponentLink1URL: https://wmsc.lcsc.com/wmsc/upload/file/pdf/v2/lcsc/2204021230_Sunlord-SDWL1608C15NGSTFN01_C2988096.pdf; ComponentLink2Description: JLCPCB Part URL; ComponentLink2URL: https://jlcpcb.com/partdetail/C2988096; ComponentLink3Description: LCSC Part URL; ComponentLink3URL: https://lcsc.com/product-detail/Inductors-SMD_Sunlord-Sunlord-SDWL1608C15NGSTFN01_C2988096.html
footprint IND-0603 (0603 (1608M) Inductor)
pins: 1, 2

## SDWL1608C15NJSTF
designator L?  Inductance: 15nH
Inductor, 15nH, ±5%, 150mΩ, 550mA, SMD 0603; Manufacturer: Sunlord; Manufacturer Part Number: SDWL1608C15NJSTF; Package Size: 0603; JLCPCB Basic Part: No; JLCPCB Part Number: C316384; Supplier 1: LCSC; Category: Inductors; Supplier Part Number 1: C316384; Tolerance: ±5%; Rated Current: 550mA; DC Resistance: 150mΩ; RoHS: Yes; ComponentLink1Description: Datasheet; ComponentLink1URL: https://wmsc.lcsc.com/wmsc/upload/file/pdf/v2/lcsc/2110081430_Sunlord-SDWL1608C15NJSTF_C316384.pdf; ComponentLink2Description: JLCPCB Part URL; ComponentLink2URL: https://jlcpcb.com/partdetail/C316384; ComponentLink3Description: LCSC Part URL; ComponentLink3URL: https://lcsc.com/product-detail/Inductors-SMD_Sunlord-Sunlord-SDWL1608C15NJSTF_C316384.html
footprint IND-0603 (0603 (1608M) Inductor)
pins: 1, 2

## SDWL1608C16NJSTFM01
designator L?  Inductance: 16nH
Inductor, 16nH, ±5%, 160mΩ, 550mA, SMD 0603; Manufacturer: Sunlord; Manufacturer Part Number: SDWL1608C16NJSTFM01; Self-Resonant Frequency: 100MHz; Q Factor: 40@250MHz; Package Size: 0603; JLCPCB Basic Part: No; JLCPCB Part Number: C408732; Supplier 1: LCSC; Category: Inductors; Supplier Part Number 1: C408732; Tolerance: ±5%; Rated Current: 550mA; DC Resistance: 160mΩ; RoHS: Yes; ComponentLink1Description: Datasheet; ComponentLink1URL: https://wmsc.lcsc.com/wmsc/upload/file/pdf/v2/lcsc/2110081530_Sunlord-SDWL1608C16NJSTFM01_C408732.pdf; ComponentLink2Description: JLCPCB Part URL; ComponentLink2URL: https://jlcpcb.com/partdetail/C408732; ComponentLink3Description: LCSC Part URL; ComponentLink3URL: https://lcsc.com/product-detail/Inductors-SMD_Sunlord-Sunlord-SDWL1608C16NJSTFM01_C408732.html
footprint IND-0603 (0603 (1608M) Inductor)
pins: 1, 2

## SDWL1608C18NGSTF
designator L?  Inductance: 18nH
Inductor, 18nH, ±2%, 150mΩ, 550mA, SMD 0603; Manufacturer: Sunlord; Manufacturer Part Number: SDWL1608C18NGSTF; Package Size: 0603; JLCPCB Basic Part: No; JLCPCB Part Number: C370324; Supplier 1: LCSC; Category: Inductors; Supplier Part Number 1: C370324; Tolerance: ±2%; Rated Current: 550mA; DC Resistance: 150mΩ; RoHS: Yes; ComponentLink1Description: Datasheet; ComponentLink1URL: https://wmsc.lcsc.com/wmsc/upload/file/pdf/v2/lcsc/2110081530_Sunlord-SDWL1608C18NGSTF_C370324.pdf; ComponentLink2Description: JLCPCB Part URL; ComponentLink2URL: https://jlcpcb.com/partdetail/C370324; ComponentLink3Description: LCSC Part URL; ComponentLink3URL: https://lcsc.com/product-detail/Inductors-SMD_Sunlord-Sunlord-SDWL1608C18NGSTF_C370324.html
footprint IND-0603 (0603 (1608M) Inductor)
pins: 1, 2

## SDWL1608C18NGSTFN01
designator L?  Inductance: 18nH
Inductor, 18nH, ±2%, SMD 0603; Manufacturer: Sunlord; Manufacturer Part Number: SDWL1608C18NGSTFN01; Package Size: 0603; JLCPCB Basic Part: No; JLCPCB Part Number: C370325; Supplier 1: LCSC; Category: Inductors; Supplier Part Number 1: C370325; Tolerance: ±2%; RoHS: Yes; ComponentLink1Description: Datasheet; ComponentLink2Description: JLCPCB Part URL; ComponentLink2URL: https://jlcpcb.com/partdetail/C370325; ComponentLink3Description: LCSC Part URL; ComponentLink3URL: https://lcsc.com/product-detail/Inductors-SMD_Sunlord-Sunlord-SDWL1608C18NGSTFN01_C370325.html
footprint IND-0603 (0603 (1608M) Inductor)
pins: 1, 2

## SDWL1608C18NJSTF
designator L?  Inductance: 18nH
Inductor, 18nH, ±5%, 150mΩ, 550mA, SMD 0603; Manufacturer: Sunlord; Manufacturer Part Number: SDWL1608C18NJSTF; Package Size: 0603; JLCPCB Basic Part: No; JLCPCB Part Number: C60031; Supplier 1: LCSC; Category: Inductors; Supplier Part Number 1: C60031; Tolerance: ±5%; Rated Current: 550mA; DC Resistance: 150mΩ; RoHS: Yes; ComponentLink1Description: Datasheet; ComponentLink1URL: https://wmsc.lcsc.com/wmsc/upload/file/pdf/v2/lcsc/2110081230_Sunlord-SDWL1608C18NJSTF_C60031.pdf; ComponentLink2Description: JLCPCB Part URL; ComponentLink2URL: https://jlcpcb.com/partdetail/C60031; ComponentLink3Description: LCSC Part URL; ComponentLink3URL: https://lcsc.com/product-detail/Inductors-SMD_Sunlord-Sunlord-SDWL1608C18NJSTF_C60031.html
footprint IND-0603 (0603 (1608M) Inductor)
pins: 1, 2

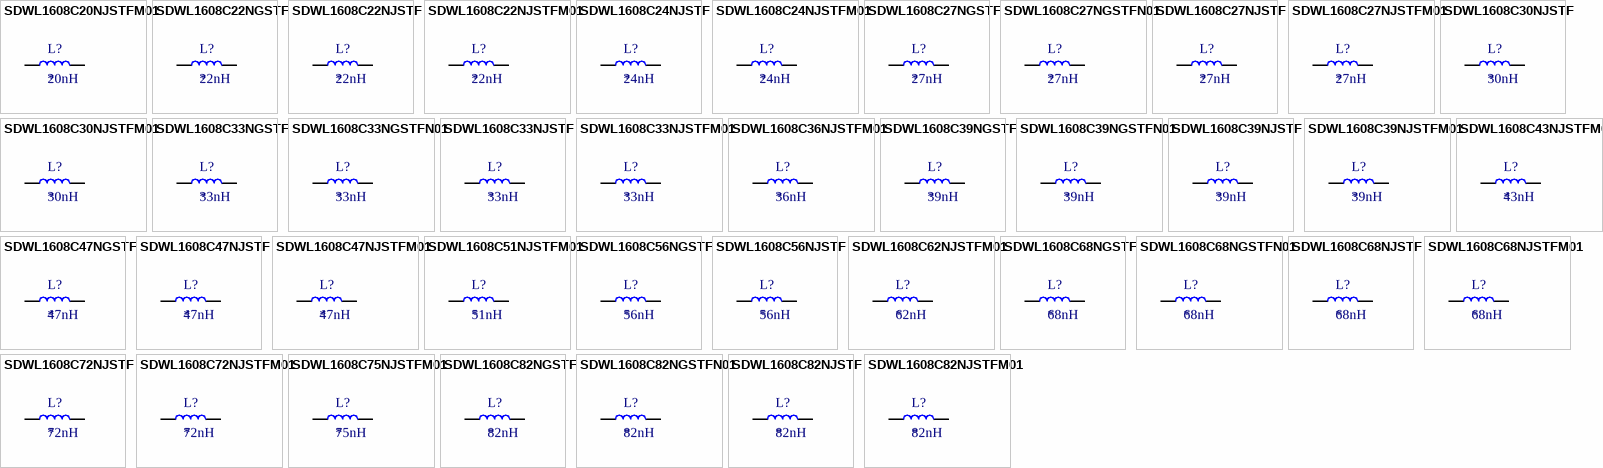
[diagram p28: symbols SDWL1608C20NJSTFM01 to SDWL1608C82NJSTFM01]

## SDWL1608C20NJSTFM01
designator L?  Inductance: 20nH
Inductor, 20nH, ±5%, 160mΩ, 550mA, SMD 0603; Manufacturer: Sunlord; Manufacturer Part Number: SDWL1608C20NJSTFM01; Self-Resonant Frequency: 100MHz; Q Factor: 40@250MHz; Package Size: 0603; JLCPCB Basic Part: No; JLCPCB Part Number: C408733; Supplier 1: LCSC; Category: Inductors; Supplier Part Number 1: C408733; Tolerance: ±5%; Rated Current: 550mA; DC Resistance: 160mΩ; RoHS: Yes; ComponentLink1Description: Datasheet; ComponentLink1URL: https://wmsc.lcsc.com/wmsc/upload/file/pdf/v2/lcsc/2110081530_Sunlord-SDWL1608C20NJSTFM01_C408733.pdf; ComponentLink2Description: JLCPCB Part URL; ComponentLink2URL: https://jlcpcb.com/partdetail/C408733; ComponentLink3Description: LCSC Part URL; ComponentLink3URL: https://lcsc.com/product-detail/Inductors-SMD_Sunlord-Sunlord-SDWL1608C20NJSTFM01_C408733.html
footprint IND-0603 (0603 (1608M) Inductor)
pins: 1, 2

## SDWL1608C22NGSTF
designator L?  Inductance: 22nH
Inductor, 22nH, ±2%, 190mΩ, 490mA, SMD 0603; Manufacturer: Sunlord; Manufacturer Part Number: SDWL1608C22NGSTF; Package Size: 0603; JLCPCB Basic Part: No; JLCPCB Part Number: C370329; Supplier 1: LCSC; Category: Inductors; Supplier Part Number 1: C370329; Tolerance: ±2%; Rated Current: 490mA; DC Resistance: 190mΩ; RoHS: Yes; ComponentLink1Description: Datasheet; ComponentLink1URL: https://wmsc.lcsc.com/wmsc/upload/file/pdf/v2/lcsc/2110081530_Sunlord-SDWL1608C22NGSTF_C370329.pdf; ComponentLink2Description: JLCPCB Part URL; ComponentLink2URL: https://jlcpcb.com/partdetail/C370329; ComponentLink3Description: LCSC Part URL; ComponentLink3URL: https://lcsc.com/product-detail/Inductors-SMD_Sunlord-Sunlord-SDWL1608C22NGSTF_C370329.html
footprint IND-0603 (0603 (1608M) Inductor)
pins: 1, 2

## SDWL1608C22NJSTF
designator L?  Inductance: 22nH
Inductor, 22nH, ±5%, 190mΩ, 490mA, SMD 0603; Manufacturer: Sunlord; Manufacturer Part Number: SDWL1608C22NJSTF; Package Size: 0603; JLCPCB Basic Part: No; JLCPCB Part Number: C316381; Supplier 1: LCSC; Category: Inductors; Supplier Part Number 1: C316381; Tolerance: ±5%; Rated Current: 490mA; DC Resistance: 190mΩ; RoHS: Yes; ComponentLink1Description: Datasheet; ComponentLink1URL: https://wmsc.lcsc.com/wmsc/upload/file/pdf/v2/lcsc/2110081430_Sunlord-SDWL1608C22NJSTF_C316381.pdf; ComponentLink2Description: JLCPCB Part URL; ComponentLink2URL: https://jlcpcb.com/partdetail/C316381; ComponentLink3Description: LCSC Part URL; ComponentLink3URL: https://lcsc.com/product-detail/Inductors-SMD_Sunlord-Sunlord-SDWL1608C22NJSTF_C316381.html
footprint IND-0603 (0603 (1608M) Inductor)
pins: 1, 2

## SDWL1608C22NJSTFM01
designator L?  Inductance: 22nH
Inductor, 22nH, ±5%, 170mΩ, 500mA, SMD 0603; Manufacturer: Sunlord; Manufacturer Part Number: SDWL1608C22NJSTFM01; Self-Resonant Frequency: 100MHz; Q Factor: 40@250MHz; Package Size: 0603; JLCPCB Basic Part: No; JLCPCB Part Number: C408734; Supplier 1: LCSC; Category: Inductors; Supplier Part Number 1: C408734; Tolerance: ±5%; Rated Current: 500mA; DC Resistance: 170mΩ; RoHS: Yes; ComponentLink1Description: Datasheet; ComponentLink1URL: https://wmsc.lcsc.com/wmsc/upload/file/pdf/v2/lcsc/2110081530_Sunlord-SDWL1608C22NJSTFM01_C408734.pdf; ComponentLink2Description: JLCPCB Part URL; ComponentLink2URL: https://jlcpcb.com/partdetail/C408734; ComponentLink3Description: LCSC Part URL; ComponentLink3URL: https://lcsc.com/product-detail/Inductors-SMD_Sunlord-Sunlord-SDWL1608C22NJSTFM01_C408734.html
footprint IND-0603 (0603 (1608M) Inductor)
pins: 1, 2
